# Altium footprint library my Library.PcbLib: 1247 footprints (part 39 of 78)
Each footprint in its own frame and in the unit in brackets; x right, y up, seen from the top. Pads: shape width x height; smd on the part's side, far side on the other; paste and mask are expansions set on the pad; w line width, h text height; cw(c..) or ccw(c..) is an arc to the next point about the centre after c.
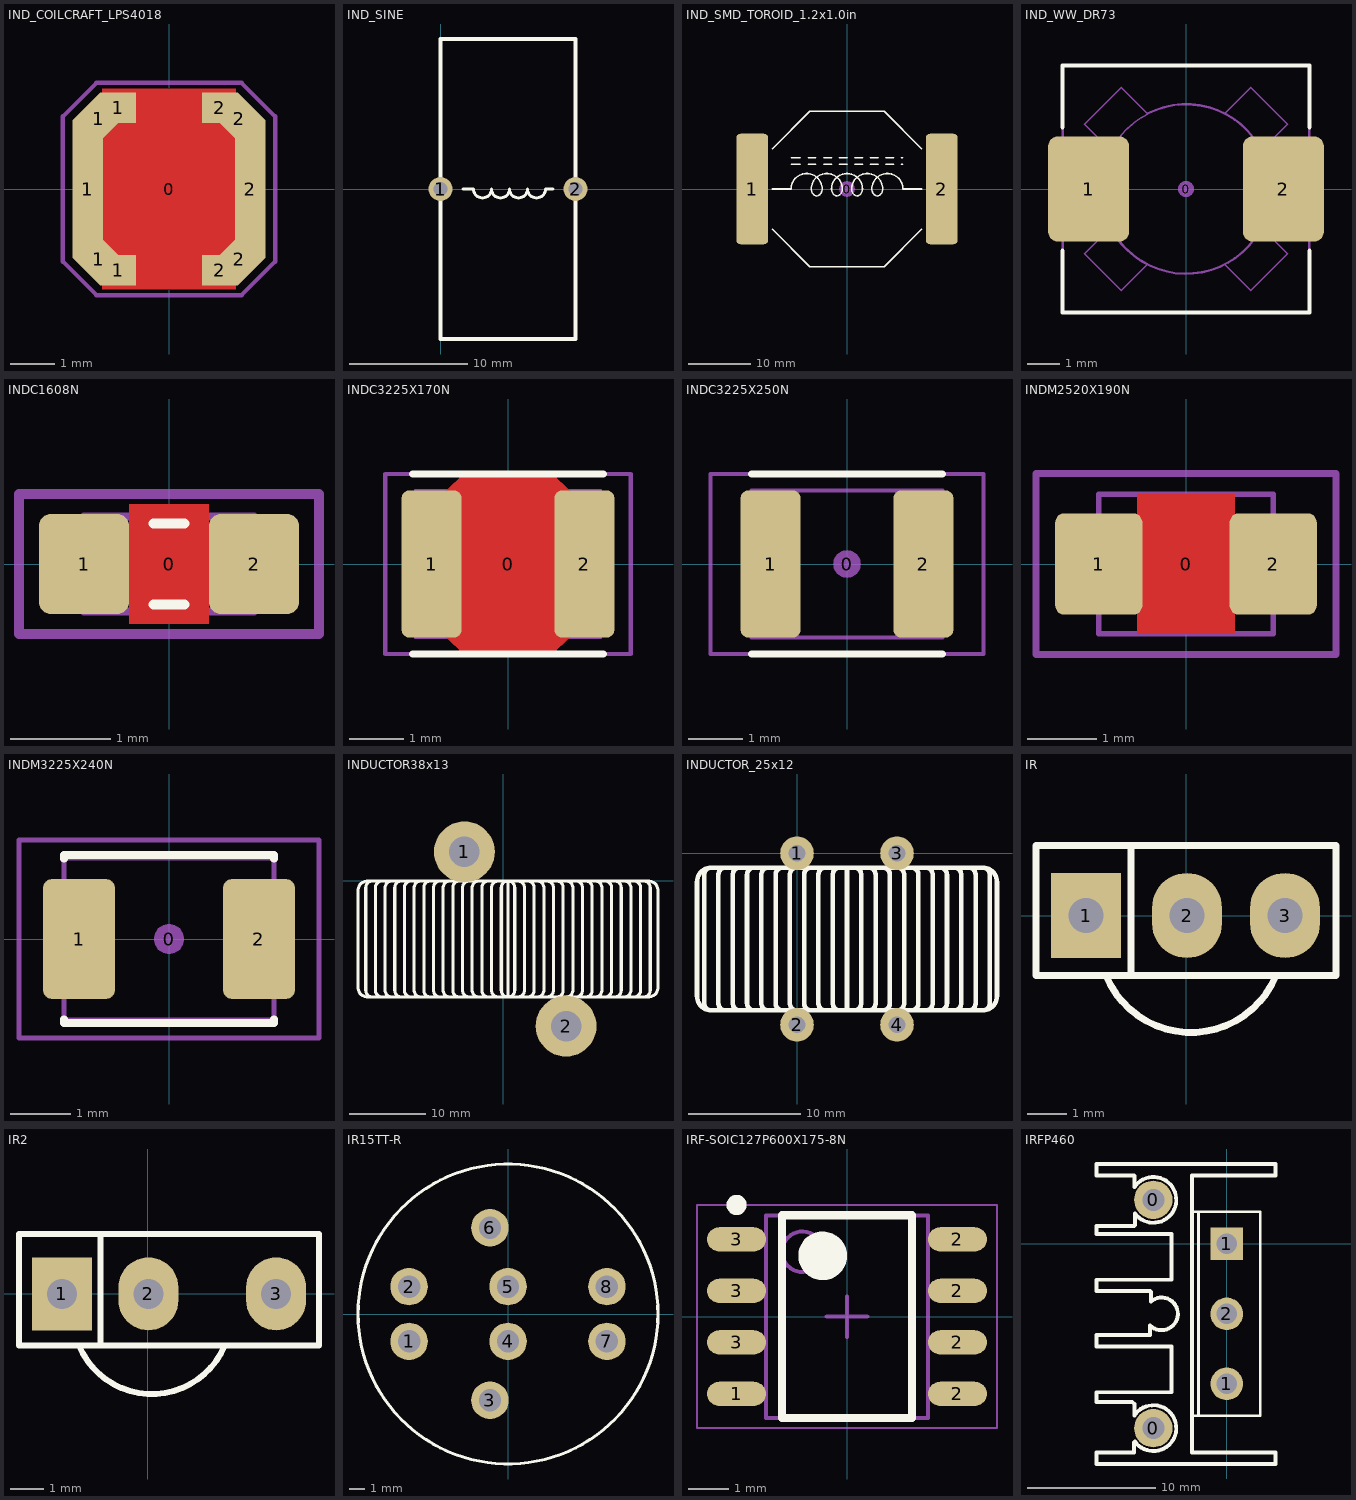
[diagram p38: the footprints below, top view; thin cyan lines are the x and y axes]

## IND_COILCRAFT_LPS4018 [mm] "Shielded Power Inductor, Body 4.0x4.0x1.8mm"
height 1.8
pads (11):
  round 0.5 on Mech15: 0(0,0)
  rrect1% 0.7x3.124 smd: 1(-1.85,0) 2(1.85,0)
  rrect1% 0.786x0.902 smd rot 45: 1(-1.603,-1.603) 2(1.603,1.603)
  rrect1% 0.786x0.902 smd rot 135: 1(-1.603,1.603) 2(1.603,-1.603)
  rrect1% 0.812x0.7 smd: 1(-1.156,-1.85) 1(-1.156,1.85) 2(1.156,-1.85) 2(1.156,1.85)
Top Layer:
  pour cut-out: -1.524,2.286 1.524,2.286 1.524,-2.286 -1.524,-2.286
Mechanical 13:
  lines w0.076: -2,-1.275 -1.275,-2 1.275,-2 2,-1.275 2,1.325 1.325,2 -1.325,2 -2,1.325 -2,-1.275
Mechanical 15:
  lines w0.1: -2.413,-1.651 -2.413,1.651 -1.651,2.413 1.651,2.413 2.413,1.651 2.413,-1.651 1.651,-2.413 -1.651,-2.413 -2.413,-1.651
3D body "Inductor Coilcraft LPS4018.STEP": height 1.79, standoff -0.01, extent -2,-2 2,2

## IND_SINE [mil]
pads (2):
  round 80 hole 47.24: 1(0,0) 2(450,0)
Top Overlay:
  lines w10: 75,0 110,0 ccw(c140,0) 170,0 ccw(c200,0) 230,0 ccw(c260,0) 290,0 ccw(c320,0) 350,0 375,0
  lines w12: 0,-500 450,-500 450,500 0,500 0,0 0,-500

## IND_SMD_TOROID_1.2x1.0in [mm] "Inductor, Toroid, 30.5mm L x 25.4mm W x 13.5mm T"
height 13.5
pads (3):
  round 2.54 on Mech15: 0(0,0)
  rrect25% 5.1x17.8 smd: 1(-15.25,0) 2(15.25,0)
Top Overlay:
  lines w0.254: -12,-6.5 -6,-12.5 6,-12.5 12,-6.5 ; -12,0 -9,0 cw(c-6.5,0) -4,0 cw(c-5.25,0) -4.691,-1.118 cw(c-4.875,0) -5.059,-1.118 cw(c-4.5,0) -5.75,0 cw(c-3.25,0) -0.75,0 cw(c-2,0) -1.441,-1.118 cw(c-1.625,0) -1.809,-1.118 cw(c-1.25,0) -2.5,0 cw(c0,0) 2.5,0 cw(c1.25,0) 1.809,-1.118 cw(c1.625,0) 1.441,-1.118 cw(c2,0) 0.75,0 cw(c3.25,0) 5.75,0 cw(c4.5,0) 5.059,-1.118 cw(c4.875,0) 4.691,-1.118 cw(c5.25,0) 4,0 cw(c6.5,0) 9,0 12,0 ; -12,6.5 -6,12.5 6,12.5 12,6.5 ; -9,4 -7.5,4 ; -9,5 -7.5,5 ; -6.25,4 -5,4 ; -6.25,5 -5,5 ; -3.75,4 -2.5,4 ; -3.75,5 -2.5,5 ; -1.25,4 0,4 ; -1.25,5 0,5 ; 1.25,4 2.5,4 ; 1.25,5 2.5,5 ; 3.75,4 5,4 ; 3.75,5 5,5 ; 6.25,4 7.5,4 ; 6.25,5 7.5,5 ; 8.75,4 9,4 ; 8.75,5 9,5
3D body: height 3.5, standoff 1.5, extent -17,-12.5 17,12.5
3D body: height 12, standoff 5, extent -10,-10 10,10

## IND_WW_DR73 [mm] "Wire-wound power inductor, Cooper Bussmann DR73 series, IPC Medium Density"
height 3.55
pads (3):
  round 0.5 on Mech15: 0(0,0)
  rrect25% 2.5x3.25 smd: 1(-3,0) 2(3,0)
Top Overlay:
  lines w0.127: -3.81,-1.905 -3.81,-3.81 3.81,-3.81 3.81,-1.905 ; -3.81,1.905 -3.81,3.81 3.81,3.81 3.81,1.905
Mechanical 13:
  circle w0.05: c0,0 r2.6
  lines w0.05: -2.574,-0.515 -2.574,-0.367 ; -2.574,0.367 -2.574,0.515 ; -2.346,-1.178 -2.346,-1.121 ; -2.346,1.121 -2.346,1.178 ; -2.273,-1.263 -2.334,-1.202 -3.129,-1.998 -1.998,-3.129 -1.202,-2.334 ; -2.273,1.263 -2.334,1.202 ; -2.202,-1.429 -2.184,-1.411 ; -2.202,1.429 -2.184,1.411 ; -1.429,-2.202 -1.411,-2.184 ; -1.263,-2.273 -1.202,-2.334 ; -1.197,-2.308 -1.202,-2.334 ; -0.237,2.589 -0.232,2.615 ; 0.232,-2.615 0.237,-2.589 ; 1.197,2.308 1.202,2.334 ; 1.202,-2.334 1.998,-3.129 3.129,-1.998 2.334,-1.202 2.273,-1.263 ; 1.263,2.273 1.202,2.334 ; 1.411,2.184 1.429,2.202 ; 2.184,-1.411 2.202,-1.429 ; 2.184,1.411 2.202,1.429 ; 2.273,1.263 2.334,1.202 3.129,1.998 1.998,3.129 1.202,2.334 ; 2.574,-0.515 2.574,-0.367 ; 2.574,0.367 2.574,0.515 ; -2.334,1.202 ccw(c0,0) -1.202,2.334 -1.998,3.129 -3.129,1.998 -2.334,1.202 ; -3.8,-3.8 -3.8,3.8 3.8,3.8 3.8,-3.8 -3.8,-3.8
Mechanical 15:
  lines w0.076: -3.8,-3.8 3.8,-3.8 3.8,3.8 -3.8,3.8 -3.8,-3.8
3D body "Cooper Bussman DR73 Series Inductor.STEP": height 3.55, standoff 0, extent -3.8,-3.8 3.8,3.8

## INDC1608N [mm] "Chip bead, Body 1.6x0.8mm, 0603, IPC Medium Density"
height 0.8
pads (3):
  round 0.254 on Mech15: 0(0,0)
  rrect25% 0.9x1 smd: 1(-0.85,0) 2(0.85,0)
Top Layer:
  pour cut-out: -0.4,0.6 0.4,0.6 0.4,-0.6 -0.4,-0.6
Top Overlay:
  lines w0.102: -0.152,-0.406 0.152,-0.406 ; -0.152,0.406 0.152,0.406
Mechanical 13:
  lines w0.076: -0.85,-0.475 -0.85,0.475 0.85,0.475 0.85,-0.475 -0.85,-0.475
Mechanical 15:
  lines w0.1: -1.5,-0.7 -1.5,0.7 1.5,0.7 1.5,-0.7 -1.5,-0.7
3D body "INDC1608X80N.step": height 0.79, standoff -0.01, extent -0.8,-0.4 0.8,0.4

## INDC3225X170N [mm] "Chip Inductor, 2-Leads, Body 3.2x2.5mm, IPC Medium Density"
height 1.7
pads (3):
  round 0.508 on Mech15: 0(0,0)
  rrect25% 1.1x2.7 smd: 1(-1.4,0) 2(1.4,0)
Top Layer:
  pour cut-out: -1.125,1.35 -0.825,1.65 0.825,1.65 1.125,1.35 1.125,-1.35 0.825,-1.65 -0.825,-1.65 -1.125,-1.35
Top Overlay:
  lines w0.127: -1.75,-1.651 1.75,-1.651 ; -1.75,1.651 1.75,1.651
Mechanical 13:
  lines w0.05: -1.7,-1.35 1.7,-1.35 1.7,1.35 -1.7,1.35 -1.7,-1.35
Mechanical 15:
  lines w0.076: -2.25,-1.65 -2.25,1.65 2.25,1.65 2.25,-1.65 -2.25,-1.65
3D body "INDC3225X170N.STEP": height 1.7, standoff 0, extent -1.71,-1.36 1.71,1.36

## INDC3225X250N [mm] "Chip Inductor, 2-Leads, Body 3.2x2.5mm, IPC Medium Density"
height 2.7
pads (3):
  round 0.508 on Mech15: 0(0,0)
  rrect25% 1.1x2.7 smd: 1(-1.4,0) 2(1.4,0)
Top Overlay:
  lines w0.127: -1.75,-1.651 1.75,-1.651 ; -1.75,1.651 1.75,1.651
Mechanical 13:
  lines w0.076: -1.75,-1.35 -1.75,1.35 1.75,1.35 1.75,-1.35 -1.75,-1.35
Mechanical 15:
  lines w0.076: -2.5,-1.65 -2.5,1.65 2.5,1.65 2.5,-1.65 -2.5,-1.65
3D body "INDC3225X250N.STEP": height 2.7, standoff 0, extent -1.7,-1.35 1.7,1.35

## INDM2520X190N [mm] "Inductor, molded body 2.5x2.0mm"
height 1.9
pads (3):
  round 0.508 on Mech15: 0(0,0)
  rrect20% 1.25x1.45 smd: 1(-1.25,0) 2(1.25,0)
Top Layer:
  pour cut-out: -0.7,1 0.7,1 0.7,-1 -0.7,-1
Mechanical 13:
  lines w0.076: -1.25,-1 -1.25,1 1.25,1 1.25,-1 -1.25,-1
Mechanical 15:
  lines w0.1: -2.15,-1.3 -2.15,1.3 2.15,1.3 2.15,-1.3 -2.15,-1.3
3D body "INDM2520X190N.STEP": height 1.79, standoff -0.01, extent -1.25,-1 1.25,1

## INDM3225X240N [mm] "Molded Inductor, 2-Leads, Body 3.2x2.5mm, IPC Medium Density"
height 2.4
pads (3):
  round 0.508 on Mech15: 0(0,0)
  rrect25% 1.2x2 smd: 1(-1.5,0) 2(1.5,0)
Top Overlay:
  lines w0.127: -1.75,-1.338 -1.75,-1.4 1.75,-1.4 1.75,-1.338 ; -1.75,1.338 -1.75,1.4 1.75,1.4 1.75,1.338
Mechanical 13:
  lines w0.076: -1.75,-1.35 -1.75,1.35 1.75,1.35 1.75,-1.35 -1.75,-1.35
Mechanical 15:
  lines w0.076: -2.5,-1.65 -2.5,1.65 2.5,1.65 2.5,-1.65 -2.5,-1.65
3D body "INDM3225X240N.STEP": height 2.4, standoff 0, extent -1.79,-1.35 1.79,1.35

## INDUCTOR38x13 [mm]
pads (2):
  round 8 hole 4: 1(-5.08,3.81) 2(8.255,-19.05)
Top Overlay:
  lines w0.406: -17.145,-15.24 cw(c-17.145,-14.351) -18.034,-14.351 -18.034,-0.889 cw(c-17.145,-0.889) -17.145,0 ; -15.875,-15.24 cw(c-15.875,-14.351) -16.764,-14.351 -16.764,-0.889 cw(c-15.875,-0.889) -15.875,0 ; -14.986,-15.24 19.05,-15.24 ccw(c19.05,-13.97) 20.32,-13.97 20.32,-1.27 ccw(c19.05,-1.27) 19.05,0 0,0 -17.78,0 ccw(c-17.78,-1.27) -19.05,-1.27 -19.05,-13.97 ccw(c-17.78,-13.97) -17.78,-15.24 -14.732,-15.24 ; -14.605,-15.24 cw(c-14.605,-14.351) -15.494,-14.351 -15.494,-0.889 cw(c-14.605,-0.889) -14.605,0 ; -13.335,-15.24 cw(c-13.335,-14.351) -14.224,-14.351 -14.224,-0.889 cw(c-13.335,-0.889) -13.335,0 ; -12.065,-15.24 cw(c-12.065,-14.351) -12.954,-14.351 -12.954,-0.889 cw(c-12.065,-0.889) -12.065,0 ; -10.795,-15.24 cw(c-10.795,-14.351) -11.684,-14.351 -11.684,-0.889 cw(c-10.795,-0.889) -10.795,0 ; -9.525,-15.24 cw(c-9.525,-14.351) -10.414,-14.351 -10.414,-0.889 cw(c-9.525,-0.889) -9.525,0 ; -8.255,-15.24 cw(c-8.255,-14.351) -9.144,-14.351 -9.144,-0.889 cw(c-8.255,-0.889) -8.255,0 ; -6.985,-15.24 cw(c-6.985,-14.351) -7.874,-14.351 -7.874,-0.889 cw(c-6.985,-0.889) -6.985,0 ; -5.715,-15.24 cw(c-5.715,-14.351) -6.604,-14.351 -6.604,-0.889 cw(c-5.715,-0.889) -5.715,0 ; -4.445,-15.24 cw(c-4.445,-14.351) -5.334,-14.351 -5.334,-0.889 cw(c-4.445,-0.889) -4.445,0 ; -3.175,-15.24 cw(c-3.175,-14.351) -4.064,-14.351 -4.064,-0.889 cw(c-3.175,-0.889) -3.175,0 ; -1.905,-15.24 cw(c-1.905,-14.351) -2.794,-14.351 -2.794,-0.889 cw(c-1.905,-0.889) -1.905,0 ; -0.635,-15.24 cw(c-0.635,-14.351) -1.524,-14.351 -1.524,-0.889 cw(c-0.635,-0.889) -0.635,0 ; 1.905,-15.24 ccw(c1.905,-14.351) 2.794,-14.351 2.794,-0.889 ccw(c1.905,-0.889) 1.905,0 ; 3.175,-15.24 ccw(c3.175,-14.351) 4.064,-14.351 4.064,-0.889 ccw(c3.175,-0.889) 3.175,0 ; 4.445,-15.24 ccw(c4.445,-14.351) 5.334,-14.351 5.334,-0.889 ccw(c4.445,-0.889) 4.445,0 ; 5.715,-15.24 ccw(c5.715,-14.351) 6.604,-14.351 6.604,-0.889 ccw(c5.715,-0.889) 5.715,0 ; 6.985,-15.24 ccw(c6.985,-14.351) 7.874,-14.351 7.874,-0.889 ccw(c6.985,-0.889) 6.985,0 ; 8.255,-15.24 ccw(c8.255,-14.351) 9.144,-14.351 9.144,-0.889 ccw(c8.255,-0.889) 8.255,0 ; 9.525,-15.24 ccw(c9.525,-14.351) 10.414,-14.351 10.414,-0.889 ccw(c9.525,-0.889) 9.525,0 ; 10.795,-15.24 ccw(c10.795,-14.351) 11.684,-14.351 11.684,-0.889 ccw(c10.795,-0.889) 10.795,0 ; 12.065,-15.24 ccw(c12.065,-14.351) 12.954,-14.351 12.954,-0.889 ccw(c12.065,-0.889) 12.065,0 ; 13.335,-15.24 ccw(c13.335,-14.351) 14.224,-14.351 14.224,-0.889 ccw(c13.335,-0.889) 13.335,0 ; 14.605,-15.24 ccw(c14.605,-14.351) 15.494,-14.351 15.494,-0.889 ccw(c14.605,-0.889) 14.605,0 ; 15.875,-15.24 ccw(c15.875,-14.351) 16.764,-14.351 16.764,-0.889 ccw(c15.875,-0.889) 15.875,0 ; 17.145,-15.24 ccw(c17.145,-14.351) 18.034,-14.351 18.034,-0.889 ccw(c17.145,-0.889) 17.145,0 ; 18.415,-15.24 ccw(c18.415,-14.351) 19.304,-14.351 19.304,-0.889 ccw(c18.415,-0.889) 18.415,0 ; 0.635,-15.24 cw(c0.635,-14.351) -0.254,-14.351 -0.254,-0.889 cw(c0.635,-0.889) 0.635,0 ; 0.635,-15.24 ccw(c0.635,-14.351) 1.524,-14.351 1.524,-0.889 ccw(c0.635,-0.889) 0.635,0 ; 0.635,-15.24 0.635,0

## INDUCTOR_25x12 [mm]
pads (4):
  round 3 hole 1.5: 1(0,0) 2(0,-15.24) 3(8.89,0) 4(8.89,-15.24)
Top Overlay:
  lines w0.406: -6.35,-13.97 cw(c-6.35,-13.335) -6.985,-13.335 -6.985,-1.905 cw(c-6.35,-1.905) -6.35,-1.27 ; -5.08,-13.97 cw(c-5.08,-13.335) -5.715,-13.335 -5.715,-1.905 cw(c-5.08,-1.905) -5.08,-1.27 ; -3.81,-13.97 cw(c-3.81,-13.335) -4.445,-13.335 -4.445,-1.905 cw(c-3.81,-1.905) -3.81,-1.27 ; -2.54,-13.97 cw(c-2.54,-13.335) -3.175,-13.335 -3.175,-1.905 cw(c-2.54,-1.905) -2.54,-1.27 ; -1.27,-13.97 cw(c-1.27,-13.335) -1.905,-13.335 -1.905,-1.905 cw(c-1.27,-1.905) -1.27,-1.27 ; 0,-13.97 cw(c0,-13.335) -0.635,-13.335 -0.635,-1.905 cw(c0,-1.905) 0,-1.27 ; 1.27,-13.97 cw(c1.27,-13.335) 0.635,-13.335 0.635,-1.905 cw(c1.27,-1.905) 1.27,-1.27 ; 2.54,-13.97 cw(c2.54,-13.335) 1.905,-13.335 1.905,-1.905 cw(c2.54,-1.905) 2.54,-1.27 ; 3.81,-13.97 cw(c3.81,-13.335) 3.175,-13.335 3.175,-1.905 cw(c3.81,-1.905) 3.81,-1.27 ; 4.445,-13.97 4.445,-1.397 ; 5.08,-13.97 ccw(c5.08,-13.335) 5.715,-13.335 5.715,-1.905 ccw(c5.08,-1.905) 5.08,-1.27 ; 6.35,-13.97 ccw(c6.35,-13.335) 6.985,-13.335 6.985,-1.905 ccw(c6.35,-1.905) 6.35,-1.27 ; 7.62,-13.97 ccw(c7.62,-13.335) 8.255,-13.335 8.255,-1.905 ccw(c7.62,-1.905) 7.62,-1.27 ; 8.89,-13.97 ccw(c8.89,-13.335) 9.525,-13.335 9.525,-1.905 ccw(c8.89,-1.905) 8.89,-1.27 ; 10.16,-13.97 ccw(c10.16,-13.335) 10.795,-13.335 10.795,-1.905 ccw(c10.16,-1.905) 10.16,-1.27 ; 11.43,-13.97 ccw(c11.43,-13.335) 12.065,-13.335 12.065,-1.905 ccw(c11.43,-1.905) 11.43,-1.27 ; 12.7,-13.97 ccw(c12.7,-13.335) 13.335,-13.335 13.335,-1.905 ccw(c12.7,-1.905) 12.7,-1.27 ; 13.97,-13.97 ccw(c13.97,-13.335) 14.605,-13.335 14.605,-1.905 ccw(c13.97,-1.905) 13.97,-1.27 ; 15.24,-13.97 ccw(c15.24,-13.335) 15.875,-13.335 15.875,-1.905 ccw(c15.24,-1.905) 15.24,-1.27 ; -7.62,-13.97 cw(c-7.62,-12.7) -8.89,-12.7 -8.89,-2.54 cw(c-7.62,-2.54) -7.62,-1.27 ; -7.62,-13.97 cw(c-7.62,-13.335) -8.255,-13.335 -8.255,-1.905 cw(c-7.62,-1.905) -7.62,-1.27 ; -7.62,-13.97 16.51,-13.97 ; -7.62,-1.27 2.54,-1.27 ; 2.54,-1.27 16.51,-1.27 ; 16.51,-13.97 ccw(c16.51,-12.7) 17.78,-12.7 17.78,-2.54 ccw(c16.51,-2.54) 16.51,-1.27 ; 16.51,-13.97 ccw(c16.51,-13.335) 17.145,-13.335 17.145,-1.905 ccw(c16.51,-1.905) 16.51,-1.27

## IR [mil] "Receiver Infared IC"
height 200
pads (3):
  rect 70x85 hole 35: 1(-100,0)
  oval 70x85 hole 35: 2(1,0) 3(99,0)
Top Overlay:
  lines w7: -80,-60 ccw(c5,-25) 90,-60 ; -55,-60 -55,70 ; -150,-60 -150,70 150,70 150,-60 -150,-60
3D body "User Library-Parallax-IR.STEP": height 457.68, standoff -78.74, extent -136.37,-11.96 139.22,460.48

## IR2 [mil] "Receiver Infared IC"
height 200
pads (3):
  rect 70x85 hole 35: 1(-100,0)
  oval 70x85 hole 35: 2(1,0) 3(150,0)
Top Overlay:
  lines w7: -80,-60 ccw(c5,-25) 90,-60 ; -55,-60 -55,70 ; -150,-60 200,-60 200,70 -150,70 -150,-60

## IR15TT-R [mm] "8 PIN"
pads (8):
  round 2.5 hole 1.5: 1(-6.6,-1.825) 2(-6.6,1.825) 3(-1.2,-5.75) 4(0,-1.825) 5(0,1.825) 6(-1.2,5.75) 7(6.6,-1.825) 8(6.6,1.825)
Top Overlay:
  circle w0.203: c0,0 r10
3D body: height 19, standoff 0, extent -9.906,-10.033 10.015,9.928
3D body: height 19.1, standoff 17.6, extent -6.858,-6.858 6.888,6.915

## IRF-SOIC127P600X175-8N [mm] "SOIC, 8-Leads, Body 4.90x3.90mm, Pitch 1.27mm, IPC Medium Density"
height 1.75
pads (8):
  oval 1.45x0.6 smd: 1(-2.725,-1.905) 2(2.725,-1.905) 2(2.725,-0.635) 2(2.725,0.635) 2(2.725,1.905) 3(-2.725,-0.635) 3(-2.725,0.635) 3(-2.725,1.905)
Top Overlay:
  circle w0.6: c-0.6,1.5 r0.3
  circle w0.25: c-2.725,2.755 r0.125
  lines w0.2: -1.6,-2.5 1.6,-2.5 1.6,2.5 -1.6,2.5 -1.6,-2.5
Mechanical 13:
  circle w0.1: c-1.1,1.6 r0.5
  lines w0.1: -2,-2.5 2,-2.5 2,2.5 -2,2.5 -2,-2.5
Mechanical 15:
  lines w0.05: -3.7,-2.75 3.7,-2.75 3.7,2.75 -3.7,2.75 -3.7,-2.75
  lines w0.1: -0.5,0 0.5,0 ; 0,-0.5 0,0.5
3D body "IRF-SOIC127P600X175-8N.step": height 1.75, standoff 0, extent -3,-2.5 3,2.5

## IRFP460 [mm]
pads (5):
  round 3 hole 1.7: 0(-5.715,-14.351) 0(-5.715,3.429)
  round 2.54 hole 1.6: 1(0,-10.9) 2(0,-5.45)
  rect 2.54x2.54 hole 1.6: 1(0,0)
Top Overlay:
  lines w0.2: -2.2,-13.4 -2.2,2.5 ; -2.7,-13.4 -2.7,2.5 2.6,2.5 2.6,-13.4 -2.7,-13.4
  lines w0.305: -2.7,2.159 -2.7,5.334 3.81,5.334 3.81,6.223 -10.16,6.223 -10.16,5.334 -7.239,5.334 -7.198,5.293 -7.198,4.418 cw(c-5.715,3.429) -7.157,2.381 -7.157,1.479 -7.239,1.397 -8.382,1.397 -10.16,1.397 -10.16,0.762 -4.318,0.762 -4.318,-2.794 -10.16,-2.794 -10.16,-3.683 -5.969,-3.683 -5.9,-3.752 -5.9,-4.48 cw(c-5.08,-5.45) -5.972,-6.354 -5.972,-7.109 -5.969,-7.112 -10.16,-7.112 -10.16,-8.001 -4.318,-8.001 -4.318,-11.557 -10.16,-11.557 -10.16,-12.319 -7.366,-12.319 -7.198,-12.487 -7.198,-13.362 cw(c-5.715,-14.351) -7.157,-15.399 -7.239,-15.482 -7.239,-16.256 -10.16,-16.256 -10.16,-17.145 3.81,-17.145 3.81,-16.256 -2.7,-16.256 -2.7,3.048